# Altium footprint library 4.49-接插件.PcbLib: 260 footprints (part 9 of 17)
Each footprint in its own frame and in the unit in brackets; x right, y up, seen from the top. Pads: shape width x height; smd on the part's side, far side on the other; paste and mask are expansions set on the pad; w line width, h text height; cw(c..) or ccw(c..) is an arc to the next point about the centre after c.
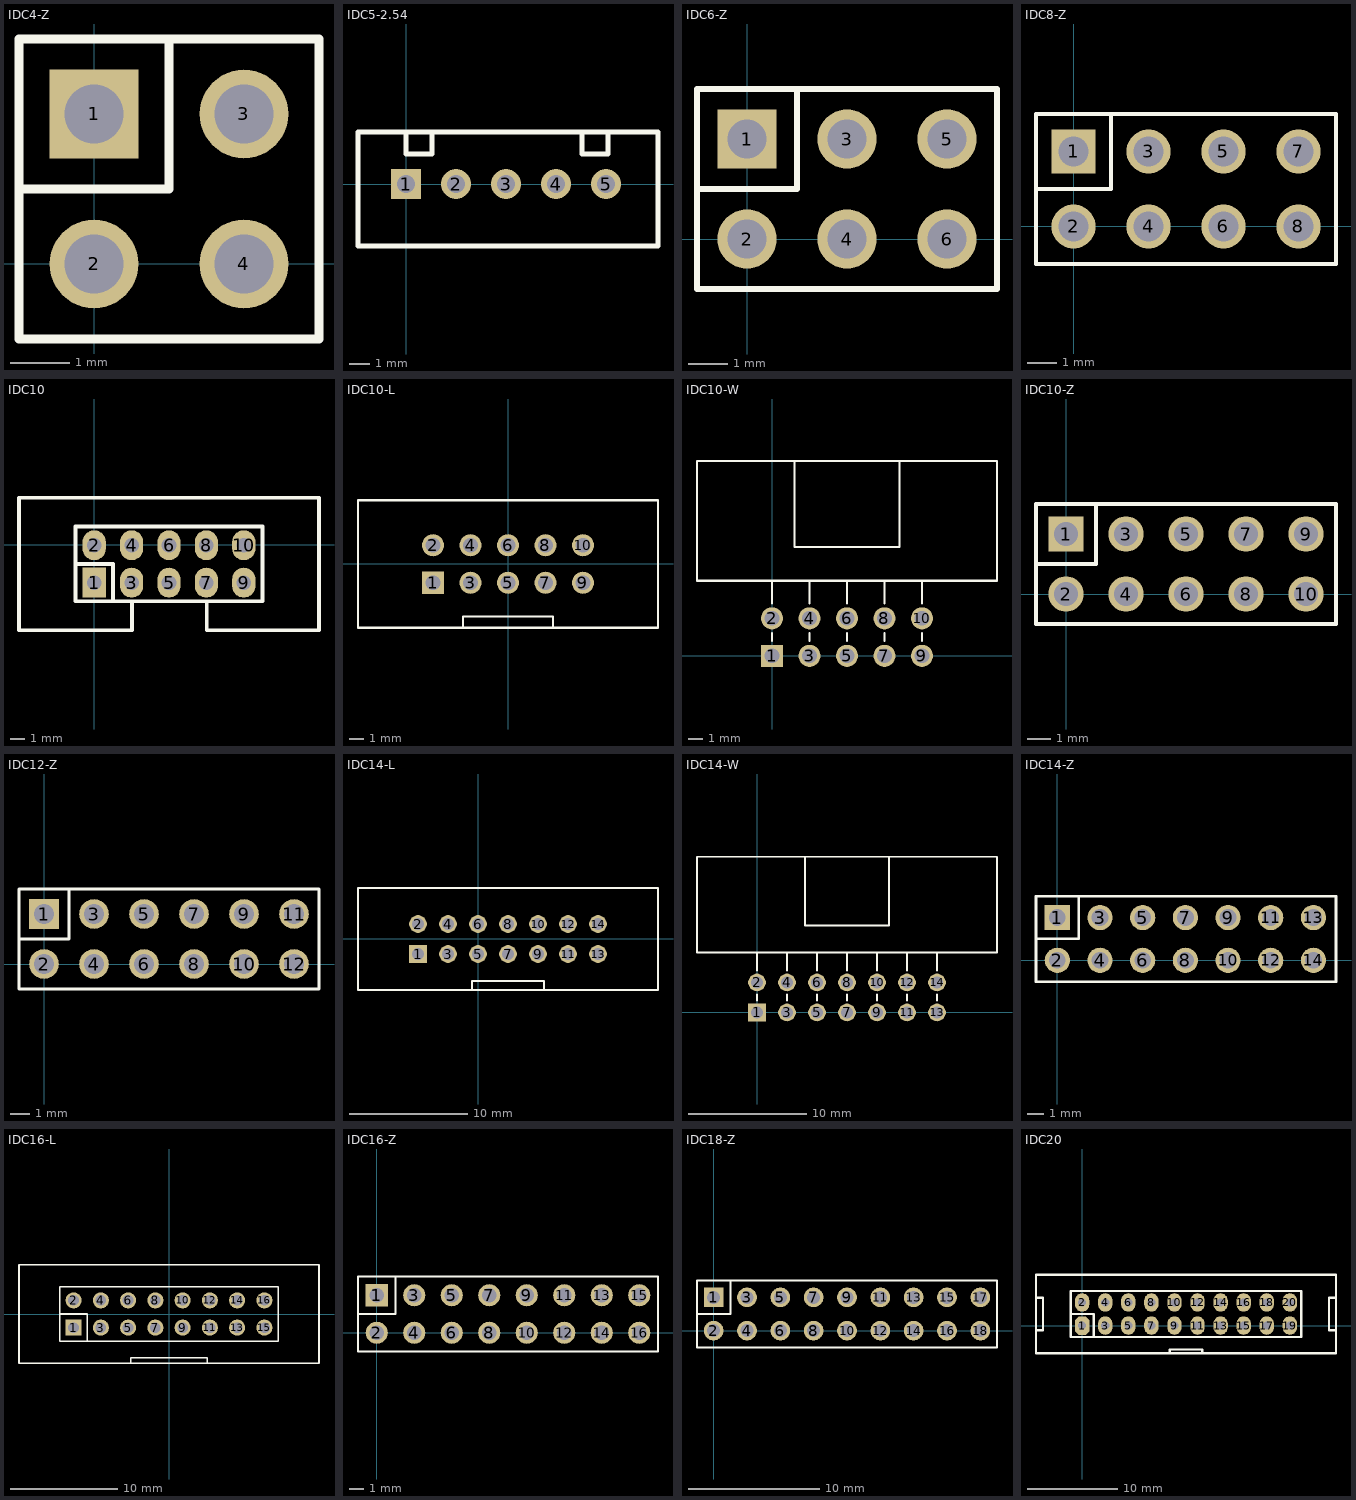
[diagram p8: the footprints below, top view; thin cyan lines are the x and y axes]

## IDC4-Z [mm]
pads (4):
  rect 1.5x1.5 hole 1: 1(0,2.54)
  round 1.5 hole 1: 2(0,0) 3(2.54,2.54) 4(2.54,0)
Top Overlay:
  lines w0.15: -1.27,1.27 1.27,1.27 1.27,3.81 ; -1.27,-1.27 3.81,-1.27 3.81,3.81 -1.27,3.81 -1.27,-1.27
3D body "IDC4.STEP": height 8.5, standoff -3.35, extent -1.27,-1.23 3.81,3.77

## IDC5-2.54 [mm]
pads (5):
  rect 1.5x1.5 hole 0.9: 1(0,0)
  round 1.5 hole 0.9: 2(2.5,0) 3(5,0) 4(7.5,0) 5(10,0)
Top Overlay:
  lines w0.254: 0,2.6 0,1.5 1.3,1.5 1.3,2.6 ; 8.8,2.6 8.8,1.5 10.1,1.5 10.1,2.6 ; -2.4,-3.1 12.6,-3.1 12.6,2.6 -2.4,2.6 -2.4,-3.1
3D body "User Library-jst-b5b-xh-a.STEP": height 7, standoff -3.4, extent -2.511,-3.388 12.519,2.362

## IDC6-Z [mm]
pads (6):
  rect 1.5x1.5 hole 1: 1(0,2.54)
  round 1.5 hole 1: 2(0,0) 3(2.54,2.54) 4(2.54,0) 5(5.08,2.54) 6(5.08,0)
Top Overlay:
  lines w0.15: -1.27,1.27 1.27,1.27 1.27,3.81 ; -1.27,-1.27 6.35,-1.27 6.35,3.81 -1.27,3.81 -1.27,-1.27
3D body "IDC6.STEP": height 8.5, standoff -3.35, extent -1.27,-1.23 6.35,3.77

## IDC8-Z [mm]
pads (8):
  rect 1.5x1.5 hole 1: 1(0,2.54)
  round 1.5 hole 1: 2(0,0) 3(2.54,2.54) 4(2.54,0) 5(5.08,2.54) 6(5.08,0) 7(7.62,2.54) 8(7.62,0)
Top Overlay:
  lines w0.15: -1.27,1.27 1.27,1.27 1.27,3.81 ; -1.27,-1.27 -1.27,3.81 8.89,3.81 8.89,-1.27 -1.27,-1.27
3D body "IDC8.STEP": height 8.5, standoff -3.35, extent -1.27,-1.23 8.89,3.77

## IDC10 [mil]
pads (10):
  rect 62x80 hole 39.37: 1(0,-102)
  oval 62x80 hole 39.37: 2(0,-2) 3(100,-102) 4(100,-2) 5(200,-102) 6(200,-2) 7(300,-102) 8(300,-2) 9(400,-102) 10(400,-2)
Top Overlay:
  lines w10: -50,-52 50,-52 50,-152 ; 101,-152 101,-229.16 -201.18,-229.16 -201.18,125.17 601.18,125.17 ; 301,-152 301,-229.16 601.18,-229.16 ; 601,-229.33 601,125 ; -50,-152 450,-152 450,48 -50,48 -50,-152
3D body "SW3dPS-HDB-10.STEP": height 366.14, standoff -98.43, extent -196.64,-230.08 598.64,140

## IDC10-L [mm]
pads (10):
  rect 1.5x1.5 hole 1: 1(-5.084,-1.29)
  round 1.5 hole 1: 2(-5.084,1.25) 3(-2.544,-1.29) 4(-2.544,1.25) 5(-0.004,-1.29) 6(-0.004,1.25) 7(2.536,-1.29) 8(2.536,1.25) 9(5.076,-1.29) 10(5.076,1.25)
Top Overlay:
  lines w0.15: -3.052,-4.338 -3.052,-3.576 3.044,-3.576 3.044,-4.338 ; -10.164,-4.338 10.156,-4.338 10.156,4.298 -10.164,4.298 -10.164,-4.338
3D body "User Library-BH-10___64.step": height 8.84, standoff -3.3, extent -10.184,-4.413 10.176,4.787

## IDC10-W [mm]
pads (10):
  rect 1.5x1.5 hole 1: 1(0,0)
  round 1.5 hole 1: 2(0,2.54) 3(2.54,0) 4(2.54,2.54) 5(5.08,0) 6(5.08,2.54) 7(7.62,0) 8(7.62,2.54) 9(10.16,0) 10(10.16,2.54)
Top Overlay:
  lines w0.15: -5.08,8.382 -5.08,13.19 15.24,13.19 15.24,5.08 -5.08,5.08 -5.08,8.636 ; 0,1.016 0,1.524 ; 0,3.556 0,5.08 ; 1.524,13.19 1.524,7.366 8.636,7.366 8.636,13.19 ; 2.54,1.016 2.54,1.524 ; 2.54,3.556 2.54,5.08 ; 5.08,1.016 5.08,1.524 ; 5.08,3.556 5.08,5.08 ; 7.62,1.016 7.62,1.524 ; 7.62,3.556 7.62,5.08 ; 10.16,1.016 10.16,1.524 ; 10.16,3.556 10.16,4.826 10.16,5.08
3D body "User Library-SLS-010-R920-01.step": height 9.11, standoff -3, extent -5.1,-0.317 15.26,13.543

## IDC10-Z [mm]
pads (10):
  rect 1.5x1.5 hole 1: 1(0,2.54)
  round 1.5 hole 1: 2(0,0) 3(2.54,2.54) 4(2.54,0) 5(5.08,2.54) 6(5.08,0) 7(7.62,2.54) 8(7.62,0) 9(10.16,2.54) 10(10.16,0)
Top Overlay:
  lines w0.15: -1.27,1.27 1.27,1.27 1.27,3.81 ; -1.27,-1.27 -1.27,3.81 11.43,3.81 11.43,-1.27 -1.27,-1.27
3D body "IDC10.STEP": height 8.5, standoff -3.35, extent -1.27,-1.23 11.43,3.77

## IDC12-Z [mm]
pads (12):
  rect 1.5x1.5 hole 1: 1(0,2.54)
  round 1.5 hole 1: 2(0,0) 3(2.54,2.54) 4(2.54,0) 5(5.08,2.54) 6(5.08,0) 7(7.62,2.54) 8(7.62,0) 9(10.16,2.54) 10(10.16,0) 11(12.7,2.54) 12(12.7,0)
Top Overlay:
  lines w0.15: -1.27,1.27 1.27,1.27 1.27,3.81 ; -1.27,-1.27 13.97,-1.27 13.97,3.81 -1.27,3.81 -1.27,-1.27
3D body "IDC12.STEP": height 8.5, standoff -3.35, extent -1.27,-1.23 13.97,3.77

## IDC14-L [mm]
pads (14):
  rect 1.5x1.5 hole 1: 1(-5.084,-1.29)
  round 1.5 hole 1: 2(-5.084,1.25) 3(-2.544,-1.29) 4(-2.544,1.25) 5(-0.004,-1.29) 6(-0.004,1.25) 7(2.536,-1.29) 8(2.536,1.25) 9(5.076,-1.29) 10(5.076,1.25) 11(7.616,-1.29) 12(7.616,1.25) 13(10.156,-1.29) 14(10.156,1.25)
Top Overlay:
  lines w0.15: -0.512,-4.338 -0.512,-3.576 5.584,-3.576 5.584,-4.338 ; -10.164,-4.338 -10.164,4.298 15.236,4.298 15.236,-4.338 -10.164,-4.338
3D body "User Library-SLS-014-S920-01.step": height 9.1, standoff -3.2, extent -10.184,-4.465 15.256,4.645

## IDC14-W [mm]
pads (14):
  rect 1.5x1.5 hole 1: 1(0,0)
  round 1.5 hole 1: 2(0,2.54) 3(2.54,0) 4(2.54,2.54) 5(5.08,0) 6(5.08,2.54) 7(7.62,0) 8(7.62,2.54) 9(10.16,0) 10(10.16,2.54) 11(12.7,0) 12(12.7,2.54) 13(15.24,0) 14(15.24,2.54)
Top Overlay:
  lines w0.15: -5.08,8.382 -5.08,13.19 20.32,13.19 20.32,5.08 -5.08,5.08 -5.08,8.636 ; 0,1.016 0,1.524 ; 0,3.556 0,5.08 ; 2.54,1.016 2.54,1.524 ; 2.54,3.556 2.54,5.08 ; 4.064,13.19 4.064,7.366 11.176,7.366 11.176,13.19 ; 5.08,1.016 5.08,1.524 ; 5.08,3.556 5.08,5.08 ; 7.62,1.016 7.62,1.524 ; 7.62,3.556 7.62,5.08 ; 10.16,1.016 10.16,1.524 ; 10.16,3.556 10.16,4.826 10.16,5.08 ; 12.7,1.016 12.7,1.524 ; 12.7,3.556 12.7,5.08 ; 15.24,1.016 15.24,1.524 ; 15.24,3.556 15.24,5.08
3D body "User Library-SLS-014-R920-01.step": height 9.11, standoff -3, extent -5.1,-0.317 20.34,13.543

## IDC14-Z [mm]
pads (14):
  rect 1.5x1.5 hole 1: 1(0,2.54)
  round 1.5 hole 1: 2(0,0) 3(2.54,2.54) 4(2.54,0) 5(5.08,2.54) 6(5.08,0) 7(7.62,2.54) 8(7.62,0) 9(10.16,2.54) 10(10.16,0) 11(12.7,2.54) 12(12.7,0) 13(15.24,2.54) 14(15.24,0)
Top Overlay:
  lines w0.15: -1.27,-1.27 -1.27,3.81 16.584,3.805 16.584,-1.275 -1.265,-1.275 ; -1.27,1.27 1.27,1.27 1.27,3.81
3D body "IDC14.STEP": height 8.5, standoff -3.35, extent -1.233,-1.23 16.547,3.77

## IDC16-L [mm]
pads (16):
  rect 1.5x1.5 hole 1: 1(-8.89,-1.27)
  round 1.5 hole 1: 2(-8.89,1.27) 3(-6.35,-1.27) 4(-6.35,1.27) 5(-3.81,-1.27) 6(-3.81,1.27) 7(-1.27,-1.27) 8(-1.27,1.27) 9(1.27,-1.27) 10(1.27,1.27) 11(3.81,-1.27) 12(3.81,1.27) 13(6.35,-1.27) 14(6.35,1.27) 15(8.89,-1.27) 16(8.89,1.27)
Top Overlay:
  lines w0.15: -10.16,0 -7.62,0 -7.62,-2.54 ; -3.556,-4.572 -3.556,-4.064 3.556,-4.064 3.556,-4.572 ; -13.97,-4.572 -13.97,4.572 13.97,4.572 13.97,-4.572 -13.97,-4.572 ; -10.16,-2.54 10.16,-2.54 10.16,2.54 -10.16,2.54 -10.16,-2.54
3D body "User Library-SLS-016-S920-01.step": height 9.1, standoff -3.2, extent -13.99,-4.455 13.99,4.455

## IDC16-Z [mm]
pads (16):
  rect 1.5x1.5 hole 1: 1(0,2.54)
  round 1.5 hole 1: 2(0,0) 3(2.54,2.54) 4(2.54,0) 5(5.08,2.54) 6(5.08,0) 7(7.62,2.54) 8(7.62,0) 9(10.16,2.54) 10(10.16,0) 11(12.7,2.54) 12(12.7,0) 13(15.24,2.54) 14(15.24,0) 15(17.78,2.54) 16(17.78,0)
Top Overlay:
  lines w0.15: -1.27,1.27 1.27,1.27 1.27,3.81 ; -1.27,-1.27 -1.27,3.81 19.05,3.81 19.05,-1.27 -1.27,-1.27
3D body "IDC16.STEP": height 8.5, standoff -3.35, extent -1.27,-1.23 19.05,3.77

## IDC18-Z [mm]
pads (18):
  rect 1.5x1.5 hole 1: 1(0,2.54)
  round 1.5 hole 1: 2(0,0) 3(2.54,2.54) 4(2.54,0) 5(5.08,2.54) 6(5.08,0) 7(7.62,2.54) 8(7.62,0) 9(10.16,2.54) 10(10.16,0) 11(12.7,2.54) 12(12.7,0) 13(15.24,2.54) 14(15.24,0) 15(17.78,2.54) 16(17.78,0) 17(20.32,2.54) 18(20.32,0)
Top Overlay:
  lines w0.15: -1.27,1.27 1.27,1.27 1.27,3.81 ; -1.27,-1.27 -1.27,3.81 21.59,3.81 21.59,-1.27 -1.27,-1.27
3D body "IDC18.STEP": height 8.5, standoff -3.35, extent -1.27,-1.23 21.59,3.77

## IDC20 [mil]
pads (20):
  oct 62x80 hole 35: 1(0,0)
  oval 62x80 hole 35: 2(0,100) 3(100,0) 4(100,100) 5(200,0) 6(200,100) 7(300,0) 8(300,100) 9(400,0) 10(400,100) 11(500,0) 12(500,100) 13(600,0) 14(600,100) 15(700,0) 16(700,100) 17(800,0) 18(800,100) 19(900,0) 20(900,100)
Top Overlay:
  lines w10: -200,-20 -170,-20 -170,120 -200,120 ; -50,50 50,50 50,-50 ; 380,-120 380,-105 ; 380,-104 520,-104 ; 520,-120 520,-105 ; 1100,-20 1070,-20 1070,120 1100,120 ; -200,-120 1100,-120 1100,220 -200,220 -200,-120 ; -50,-50 25,-50 950,-50 950,150 25,150 -50,150 -50,-50
3D body "SW3dPS-BH-20.STEP": height 352.36, standoff -114.17, extent -198,-122.27 1102,236